# Altium footprint library Universal components.PcbLib: 101 footprints (part 6 of 7)
Each footprint in its own frame and in the unit in brackets; x right, y up, seen from the top. Pads: shape width x height; smd on the part's side, far side on the other; paste and mask are expansions set on the pad; w line width, h text height; cw(c..) or ccw(c..) is an arc to the next point about the centre after c.
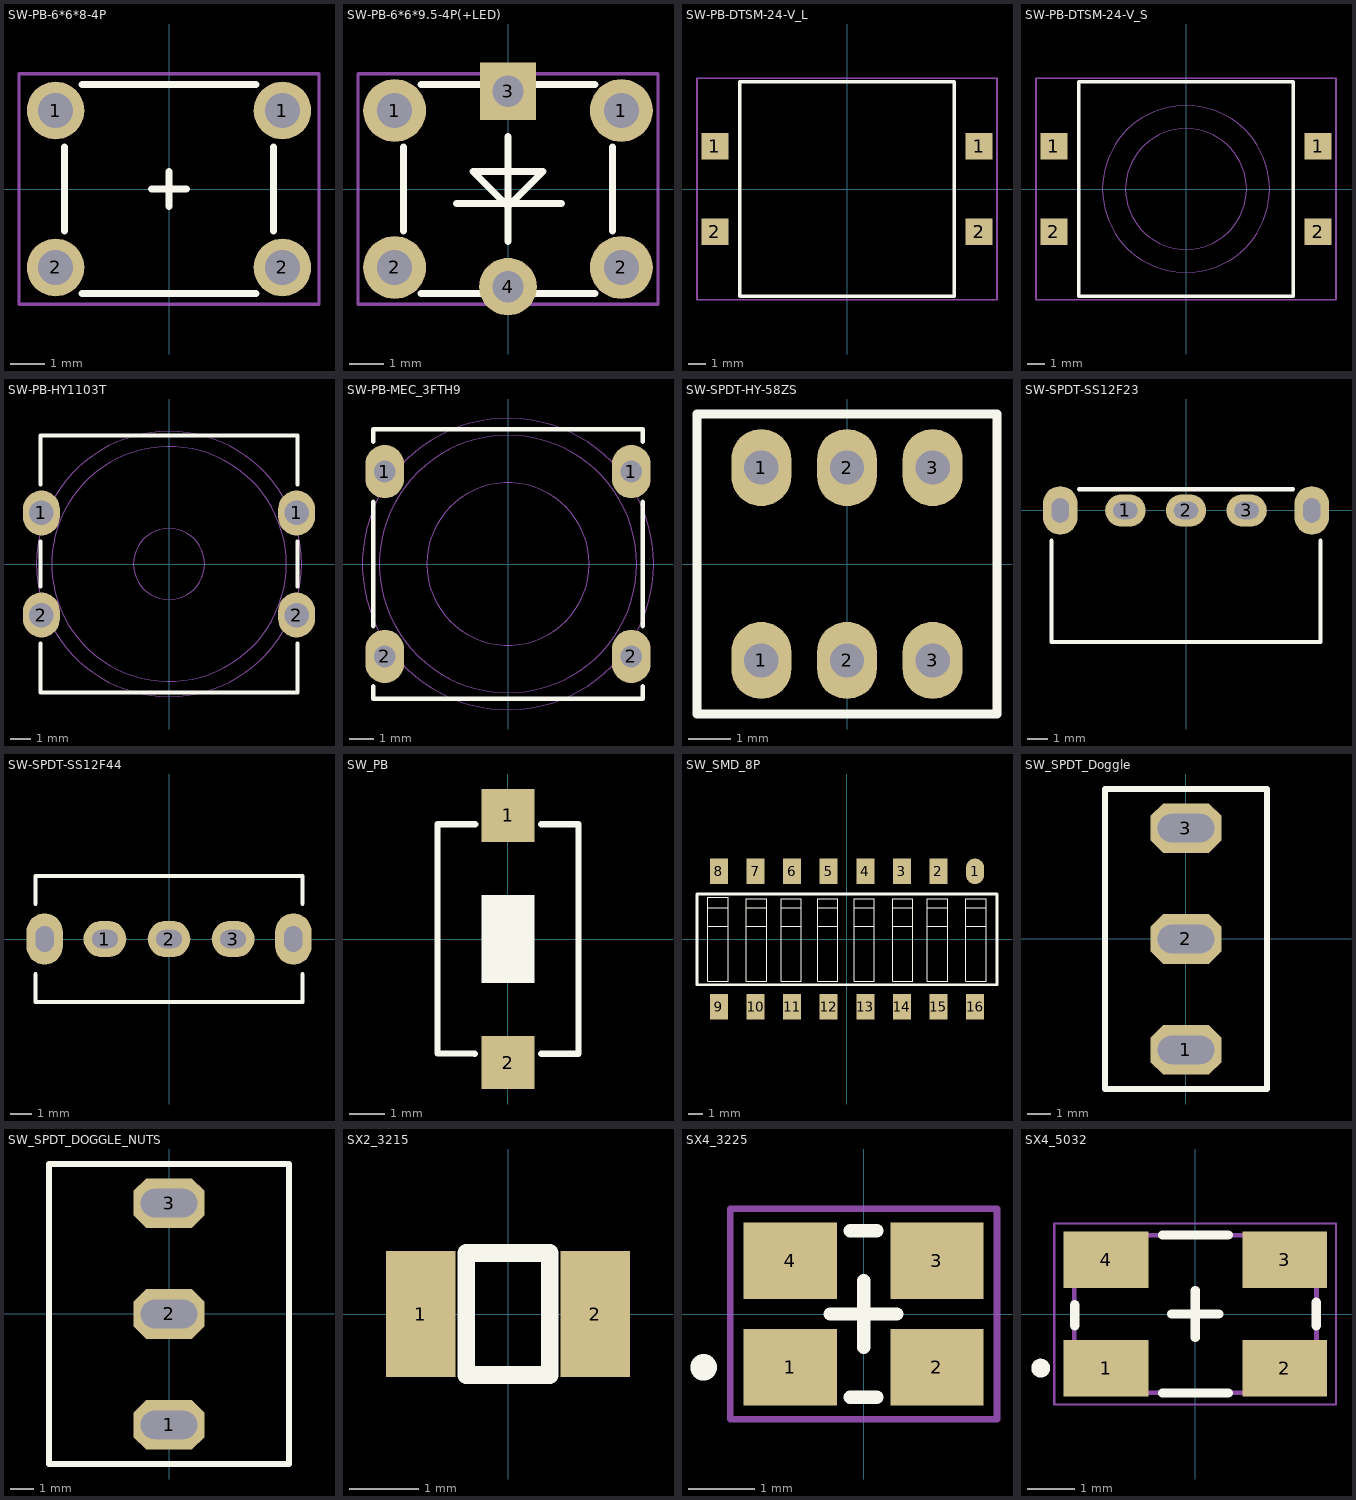
[diagram p5: the footprints below, top view; thin cyan lines are the x and y axes]

## SW-PB-6*6*8-4P [mm]
pads (4):
  round 1.65 hole 1 paste+0 mask+0.1: 1(-3.25,2.25) 1(3.25,2.25) 2(-3.25,-2.25) 2(3.25,-2.25)
Top Overlay:
  lines w0.2: -3,-1.2 -3,1.2 ; -2.5,-3 2.5,-3 ; -2.5,3 2.5,3 ; -0.5,0 0.5,0 ; 0,-0.5 0,0.5 ; 3,-1.2 3,1.2
Mechanical 15:
  lines w0.1: -4.3,-3.3 4.3,-3.3 4.3,3.3 -4.3,3.3 -4.3,-3.3
3D body "小按钮.STEP": height 9.49, standoff -0.01, extent -3.7,-3.7 3.7,3.7

## SW-PB-6*6*9.5-4P(+LED) [mm] "Power switch"
pads (6):
  round 1.8 hole 1 paste+0 mask+0.1: 1(-3.25,2.25) 1(3.25,2.25) 2(-3.25,-2.25) 2(3.25,-2.25)
  rect 1.6x1.65 hole 0.9 paste+0 mask+0.1: 3(0,2.8)
  round 1.65 hole 0.9 paste+0 mask+0.1: 4(0,-2.8)
Top Overlay:
  lines w0.2: -3,-1.2 -3,1.2 ; -2.5,-3 2.5,-3 ; -2.5,3 2.5,3 ; -1.47,-0.41 1.53,-0.41 ; 0,-1.5 0,1.5 ; 3,-1.2 3,1.2 ; -1,0.5 1,0.5 0,-0.5 -1,0.5
Mechanical 15:
  lines w0.1: -4.3,-3.3 4.3,-3.3 4.3,3.3 -4.3,3.3 -4.3,-3.3
3D body "电源按钮.STEP": height 9.49, standoff -0.01, extent -5,-5 5,5

## SW-PB-DTSM-24-V_L [mm]
pads (4):
  rect 1.6x1.55 smd paste+0 mask+0.1: 1(-7.75,2.5) 1(7.75,2.5) 2(-7.75,-2.5) 2(7.75,-2.5)
Top Overlay:
  lines w0.2: -6.3,-6.3 6.3,-6.3 6.3,6.3 -6.3,6.3 -6.3,-6.3
Mechanical 15:
  lines w0.1: -8.8,-6.5 8.8,-6.5 8.8,6.5 -8.8,6.5 -8.8,-6.5
3D body "按键.stp": height 11.4, standoff 0, extent -6,-6 6,6

## SW-PB-DTSM-24-V_S [mm]
pads (4):
  rect 1.6x1.55 smd paste+0 mask+0.1: 1(-7.75,2.5) 1(7.75,2.5) 2(-7.75,-2.5) 2(7.75,-2.5)
Top Overlay:
  lines w0.2: -6.3,-6.3 6.3,-6.3 6.3,6.3 -6.3,6.3 -6.3,-6.3
Mechanical 13:
  circle w0.01: c0,0 r3.55
  circle w0.01: c0,0 r4.9
Mechanical 15:
  lines w0.1: -8.8,-6.5 8.8,-6.5 8.8,6.5 -8.8,6.5 -8.8,-6.5
3D body: height 3.6, standoff 0.1, extent -6,-6 6,6
3D body: height 4.4, standoff 3.6, extent -3.55,-3.55 3.549,3.549
3D body: height 5.7, standoff 4.4, extent -1.5,-1.5 1.5,1.5
3D body: height 7.4, standoff 5.7, extent -1.9,-1.9 1.9,1.9
3D body: height 9.3, standoff 5.7, extent -4.899,-4.899 4.899,4.899

## SW-PB-HY1103T [mm]
pads (4):
  oval 1.8x2.2 hole 1.2 paste+0 mask+0.1: 1(-6.25,2.5) 1(6.25,2.5) 2(-6.25,-2.5) 2(6.25,-2.5)
Top Overlay:
  lines w0.2: -6.3,-3.9 -6.3,-6.3 6.3,-6.3 6.3,-3.9 ; -6.3,-1.1 -6.3,1.1 ; -6.3,3.9 -6.3,6.3 6.3,6.3 6.3,3.9 ; 6.3,-1.1 6.3,1.1
Mechanical 13:
  circle w0.01: c0,0 r5.75
  circle w0.01: c0,0 r6.5
  circle w0.01: c0,0 r1.75
3D body: height 11.3, standoff 6.3, extent -5.75,-5.75 5.749,5.749
3D body: height 4.3, standoff 0, extent -6,-6 6,6
3D body: height 6.3, standoff 5.5, extent -6.499,-6.499 6.499,6.499
3D body: height 5.5, standoff 4.3, extent -1.749,-1.749 1.749,1.749

## SW-PB-MEC_3FTH9 [mm]
pads (4):
  oval 1.6x2.2 hole 0.9 paste+0 mask+0.1: 1(-5.08,3.81) 1(5.08,3.81) 2(-5.08,-3.81) 2(5.08,-3.81)
Top Overlay:
  lines w0.2: -5.55,-5.05 -5.55,-5.55 5.55,-5.55 5.55,-5.05 ; -5.55,-2.55 -5.55,2.55 ; -5.55,5.05 -5.55,5.55 5.55,5.55 5.55,5.05 ; 5.55,-2.55 5.55,2.55
Mechanical 13:
  circle w0.01: c0,0 r6
  circle w0.01: c0,0 r3.35
  circle w0.01: c0,0 r5.3
3D body: height 14.9, standoff 8.2, extent -5.299,-5.299 5.299,5.299
3D body: height 6.4, standoff 0, extent -5.05,-5.05 5.05,5.05
3D body: height 7.4, standoff 6.4, extent -3.349,-3.349 3.349,3.349
3D body: height 8.2, standoff 7.4, extent -5.999,-5.999 5.999,5.999

## SW-SPDT-HY-58ZS [mm]
pads (6):
  oval 1.4x1.8 hole 0.8 paste+0 mask+0.1: 1(-2,-2.25) 1(-2,2.25) 2(0,-2.25) 2(0,2.25) 3(2,-2.25) 3(2,2.25)
Top Overlay:
  lines w0.2: 3.5,3.49 3.5,-3.5 -3.5,-3.5 -3.5,3.5 3.5,3.5
3D body: height 10, standoff 7.3, extent -1.25,-1 1.25,1
3D body: height 7.3, standoff 5, extent -1.8,-1.5 1.8,1.5
3D body: height 5, standoff 0, extent -2.9,-2.9 2.9,2.9
3D body: height 15, standoff 8.3, extent -3.099,-3.099 3.099,3.099

## SW-SPDT-SS12F23 [mm]
pads (5):
  oval 2x1.6 hole 0.85 slot 1.2 at 0 deg paste+0 mask+0.1: 1(-3,0) 2(0,0) 3(3,0)
  oval 1.7x2.4 hole 0.85 slot 1.2 at 90 deg paste+0 mask+0.1: ""(-6.225,0) ""(6.225,0)
Top Overlay:
  lines w0.2: -6.65,-1.5 -6.65,-6.5 6.65,-6.5 6.65,-1.5 ; -5.3,1.05 5.3,1.05
3D body: height 5.5, standoff 0, extent -6.45,-6.3 6.45,0.6
3D body: height 4.35, standoff 1.15, extent -3.25,-9.3 3.25,-6.3

## SW-SPDT-SS12F44 [mm]
pads (5):
  oval 2x1.7 hole 0.85 slot 1.2 at 0 deg paste+0 mask+0.1: 1(-3,0) 2(0,0) 3(3,0)
  oval 1.7x2.4 hole 0.85 slot 1.2 at 90 deg paste+0 mask+0.1: ""(-5.825,0) ""(5.825,0)
Top Overlay:
  lines w0.2: -6.25,-1.65 -6.25,-2.95 6.25,-2.95 6.25,-1.65 ; -6.25,1.65 -6.25,2.95 6.25,2.95 6.25,1.65
3D body: height 6, standoff 0, extent -6.05,-2.75 6.05,2.75
3D body: height 9, standoff 6, extent -3.12,-1.5 3.12,1.5

## SW_PB [mm] "轻触开关"
pads (2):
  rect 1.5x1.5 smd: 1(0,3.5) 2(0,-3.5)
Top Overlay:
  region: -0.747,1.253 -0.747,-1.247 0.753,-1.247 0.753,1.253
  lines w0.178: -0.94,-3.252 -2,-3.246 -2,3.25 -0.93,3.25 ; 0.94,-3.25 2,-3.25 2,3.25 0.94,3.25
3D body: height 1.2, standoff 0.8, extent -0.762,-1.199 0.762,1.214
3D body: height 0.8, standoff 0, extent -2.032,-3.231 2.032,3.246

## SW_SMD_8P [mil] "DIP Switch 8P SMD"
pads (16):
  oval 49.43x70.06 smd: 1(350,185)
  rect 49.43x70.06 smd: 2(250,185) 3(150,185) 4(50,185) 5(-50,185) 6(-150,185) 7(-250,185) 8(-350,185) 9(-350,-185) 10(-250,-185) 11(-150,-185) 12(-50,-185) 13(50,-185) 14(150,-185) 15(250,-185) 16(350,-185)
Top Overlay:
  lines w0.98: -380,-115 -325,-115 -325,113.74 -380,113.74 ; -380,8.44 -380,85.31 ; -379.37,35 -340,35 ; -379.37,85 -340,85
  lines w1: -380,-115 -380,8.44 ; -380,85.31 -380,113.74 ; -340,35 -325,35 ; -340,85 -325,85 ; -275,35 -220,35 ; -275,85 -220,85 ; -180,35 -125,35 ; -180,85 -125,85 ; -80,35 -25,35 ; -80,85 -25,85 ; 20,35 75,35 ; 20,85 75,85 ; 125,35 180,35 ; 125,85 180,85 ; 220,35 275,35 ; 220,85 275,85 ; 325,35 380,35 ; 325,85 380,85 ; -275,-115 -220,-115 -220,110 -275,110 -275,-115 ; -180,-115 -180,110 -125,110 -125,-115 -180,-115 ; -80,-115 -80,110 -25,110 -25,-115 -80,-115 ; 20,-115 20,110 75,110 75,-115 20,-115 ; 125,-115 125,110 180,110 180,-115 125,-115 ; 220,-115 220,110 275,110 275,-115 220,-115 ; 325,-115 325,110 380,110 380,-115 325,-115
  lines w7.87: -410,-125 410,-125 410,122.6 -410,122.6
  lines w8: -410,-125 -410,122.6
3D body "User Library-DIP SW 8P.SLDPRT": height 159.45, standoff -3.94, extent -428.94,-194.88 428.94,194.88

## SW_SPDT_Doggle [mm] "Toggle switch"
pads (3):
  oct 3x2.1 hole 1.2 slot 2.4 at 0 deg: 1(0,-4.7) 2(0,0) 3(0,4.7)
Top Overlay:
  lines w0.254: -3.43,-6.358 3.43,-6.358 3.43,6.358 -3.43,6.358 -3.43,-6.358
3D body "User Library-7101SYZBE CK switch.SLDPRT": height 28.45, standoff -3.93, extent -3.43,-6.358 3.43,6.358

## SW_SPDT_DOGGLE_NUTS [mm] "Toggle Switch with nuts and washer"
pads (3):
  oct 3x2.1 hole 1.2 slot 2.4 at 0 deg: 1(0,-4.7) 2(0,0) 3(0,4.7)
Top Overlay:
  lines w0.254: -5.076,-6.358 5.076,-6.358 5.076,6.358 -5.076,6.358 -5.076,-6.358
3D body "User Library-7101SYZQE_switch-toggle.SLDPRT": height 28.45, standoff -3.93, extent -5.076,-6.358 5.076,6.358

## SX2_3215 [mm]
pads (2):
  rect 1x1.8 smd: 1(-1.25,0) 2(1.25,0)
Top Overlay:
  lines w0.254: -0.6,-0.875 -0.6,0.875 0.6,0.875 0.6,-0.875 -0.6,-0.875
3D body "User Library-Siward_SX3215.STEP": height 0.81, standoff 0, extent -1.6,-0.75 1.6,0.75
3D body: height 1, standoff 0, extent -0.1,0.3 -0.1,0.3

## SX4_3225 [mm]
pads (4):
  rect 1.4x1.15 smd paste+0 mask+0.1: 1(-1.1,-0.8) 2(1.1,-0.8) 3(1.1,0.8) 4(-1.1,0.8)
Top Overlay:
  circle w0.2: c-2.4,-0.8 r0.1
  lines w0.2: -0.5,0 0.5,0 ; -0.2,-1.25 0.2,-1.25 ; -0.2,1.25 0.2,1.25 ; 0,-0.5 0,0.5
Mechanical 15:
  lines w0.1: -2,-1.58 2,-1.58 2,1.58 -2,1.58 -2,-1.58
3D body "User Library-3225-1.step": height 0.61, standoff 0, extent -1.6,-1.25 1.6,1.25

## SX4_5032 [mm]
height 1.05
pads (4):
  rect 1.8x1.2 smd: 1(-1.9,-1.15) 2(1.9,-1.15) 3(1.9,1.15) 4(-1.9,1.15)
Top Overlay:
  circle w0.2: c-3.29,-1.15 r0.1
  lines w0.2: -2.57,-0.25 -2.57,0.2 ; -0.7,-1.68 0.7,-1.68 ; -0.7,1.68 0.7,1.68 ; -0.5,0 0.5,0 ; 0,-0.5 0,0.5 ; 2.57,-0.25 2.57,0.25
Mechanical 13:
  lines w0.1: -2.575,-1.675 2.575,-1.675 2.575,1.675 -2.575,1.675 -2.575,-1.675
Mechanical 15:
  lines w0.05: -3,-1.925 2.99,-1.925 2.99,1.925 -3,1.925 -3,-1.925
  lines w0.1: -0.5,0 0.5,0 ; 0,-0.5 0,0.5
3D body "User Library-0532.step": height 0.9, standoff -0.01, extent -2.5,-1.6 2.5,1.6